# Altium footprint library NDLib.PCBLIB: 499 footprints (part 7 of 32)
Each footprint in its own frame and in the unit in brackets; x right, y up, seen from the top. Pads: shape width x height; smd on the part's side, far side on the other; paste and mask are expansions set on the pad; w line width, h text height; cw(c..) or ccw(c..) is an arc to the next point about the centre after c.
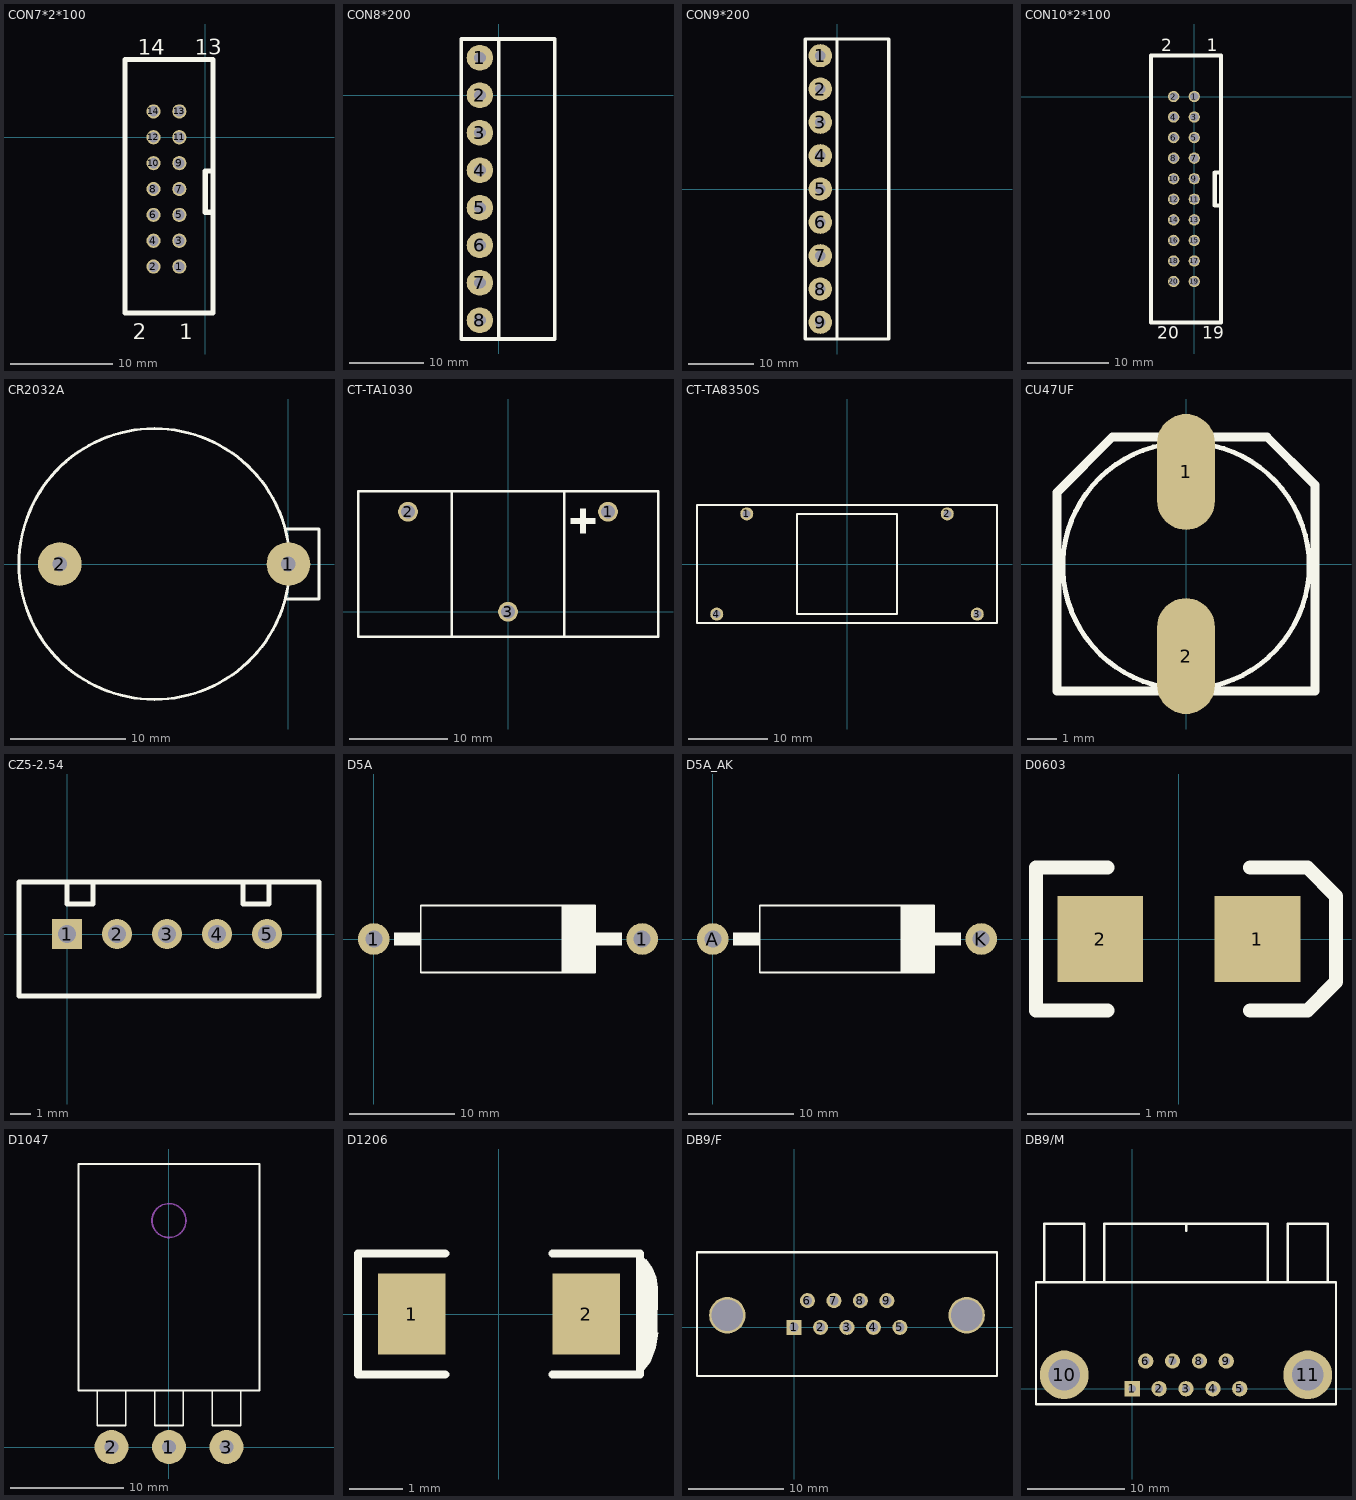
[diagram p6: the footprints below, top view; thin cyan lines are the x and y axes]

## CON7*2*100 [mil]
pads (14):
  round 55 hole 40: 1(-100,-500) 2(-200,-500) 3(-100,-400) 4(-200,-400) 5(-100,-300) 6(-200,-300) 7(-100,-200) 8(-200,-200) 9(-100,-100) 10(-200,-100) 11(-100,0) 12(-200,0) 13(-100,100) 14(-200,100)
TopOverlay:
  lines w19.68: -310,-680 -310,300 30,300 30,-680 -310,-680 ; 0,-290 30,-290 30,-130 0,-130 0,-290
  text "14" at -260,320 h60
  text "1" at -100,-780 h60
  text "2" at -280,-780 h60
  text "13" at -40,320 h60

## CON8*200 [mm]
pads (8):
  oval 3.58x3.5 hole 1.6: 1(-2.54,5.08) 2(-2.54,0) 3(-2.54,-5.08) 4(-2.54,-10.16) 5(-2.54,-15.24) 6(-2.54,-20.32) 7(-2.54,-25.4) 8(-2.54,-30.48)
TopOverlay:
  lines w0.5: -5.08,7.62 0,7.62 ; -5.08,7.62 7.62,7.62 7.62,-33.02 -5.08,-33.02 -5.08,7.62 ; 0,7.62 0,-33.02 0,7.62

## CON9*200 [mm]
pads (9):
  oval 3.58x3.5 hole 1.6: 1(-2.54,20.32) 2(-2.54,15.24) 3(-2.54,10.16) 4(-2.54,5.08) 5(-2.54,0) 6(-2.54,-5.08) 7(-2.54,-10.16) 8(-2.54,-15.24) 9(-2.54,-20.32)
TopOverlay:
  lines w0.5: 0,-22.86 0,22.86 ; -4.826,-22.86 7.874,-22.86 7.874,22.86 -4.826,22.86 -4.826,-22.86

## CON10*2*100 [mil]
pads (20):
  round 55 hole 40: 1(0,0) 2(-100,0) 3(0,-100) 4(-100,-100) 5(0,-200) 6(-100,-200) 7(0,-300) 8(-100,-300) 9(0,-400) 10(-100,-400) 11(0,-500) 12(-100,-500) 13(0,-600) 14(-100,-600) 15(0,-700) 16(-100,-700) 17(0,-800) 18(-100,-800) 19(0,-900) 20(-100,-900)
TopOverlay:
  lines w19.68: -210,-1100 -210,200 130,200 130,-1100 -210,-1100 ; 100,-530 130,-530 130,-370 100,-370 100,-530
  text "2" at -160,220 h60
  text "19" at 40,-1180 h60
  text "20" at -180,-1180 h60
  text "1" at 60,220 h60

## CR2032A [mil]
pads (2):
  round 150 hole 50: 1(0,0) 2(-785,0)
TopOverlay:
  circle w10: c-460,0 r465
  lines w10: -10,-120 105,-120 105,120 -10,120

## CT-TA1030 [mm]
height 39
pads (3):
  round 2 hole 1.397: 1(10.16,10.16) 2(-10.16,10.16) 3(0,0)
TopOverlay:
  region: 7.938,7.938 7.938,10.477 7.302,10.477 7.302,7.938
  rectangle: 6.35,8.89 8.89,9.525
  lines w0.254: -15.24,-2.54 15.24,-2.54 15.24,12.24 -15.24,12.24 -15.24,-2.54 ; -5.715,-2.54 5.715,-2.54 5.715,12.24 -5.715,12.24 -5.715,-2.54

## CT-TA8350S [mil]
height 1535.43
pads (4):
  round 65 hole 40: 1(-500,250) 2(500,250) 3(649.61,-250) 4(-649.61,-250)
TopOverlay:
  lines w10: -748.03,-295.28 -748.03,295.28 748.03,295.28 748.03,-295.28 -748.03,-295.28 ; -250,-250 -250,250 250,250 250,-250 -250,-250

## CU47UF [mm]
height 8
pads (2):
  oval 2x4 smd: 1(0,3.175) 2(0,-3.175)
TopOverlay:
  circle w0.17: c0,-0.063 r4.25
  lines w0.305: -4.445,-4.381 4.445,-4.381 4.445,2.731 2.794,4.382 -2.54,4.382 -4.445,2.477 -4.445,-4.381

## CZ5-2.54 [mm]
height 5.08
pads (5):
  rect 1.5x1.5 hole 0.9: 1(0,0)
  round 1.5 hole 0.9: 2(2.5,0) 3(5,0) 4(7.5,0) 5(10,0)
TopOverlay:
  lines w0.254: 0,2.6 0,1.5 1.3,1.5 1.3,2.6 ; 8.8,2.6 8.8,1.5 10.1,1.5 10.1,2.6 ; -2.4,-3.1 -2.4,2.6 12.6,2.6 12.6,-3.1 -2.4,-3.1
3D body: height 7, standoff -3.4, extent -2.511,-3.388 12.519,2.362

## D5A [mm]
pads (2):
  round 3 hole 1.6: 1(0,0) 1(25.4,0)
TopOverlay:
  rectangle: 17.78,-3.175 20.955,3.175
  rectangle: 1.905,-0.635 4.445,0.635
  region: 23.495,0.635 20.955,0.635 20.955,-0.635 23.495,-0.635
  lines w0.152: 4.445,-3.175 20.955,-3.175 20.955,3.175 4.445,3.175 4.445,-3.175

## D5A_AK [mm]
height 4
pads (2):
  round 3 hole 1.6: A(0,0) K(25.4,0)
TopOverlay:
  rectangle: 17.78,-3.175 20.955,3.175
  rectangle: 1.905,-0.635 4.445,0.635
  region: 23.495,0.635 20.955,0.635 20.955,-0.635 23.495,-0.635
  lines w0.152: 4.445,-3.175 20.955,-3.175 20.955,3.175 4.445,3.175 4.445,-3.175
3D body: height 4.33, standoff 0, extent 7.226,-1.333 15.634,1.334

## D0603 [mil]
pads (2):
  rect 30x30 smd: 1(27.5,0) 2(-27.5,0)
TopOverlay:
  lines w5: -25,-25 -50,-25 -50,25 -25,25 ; 25,-25 45,-25 55,-15 55,15 45,25 25,25

## D1047 [mm]
pads (3):
  round 3 hole 1.2: 1(0,0) 2(-5.08,0) 3(5.08,0)
TopOverlay:
  lines w0.152: -6.35,5 -6.35,1.905 -3.81,1.905 -3.81,5 ; -1.27,5 -1.27,1.905 1.27,1.905 1.27,5 ; 3.81,5 3.81,1.905 6.35,1.905 6.35,5 ; -8,5 8,5 8,25 -8,25 -8,5
Mechanical1:
  circle w0.152: c0,20 r1.5

## D1206 [mil]
pads (2):
  rect 50x60 smd: 1(-65,0) 2(65,0)
TopOverlay:
  region: 105,-45 105.61,-44.93 112.59,-35.82 116.99,-25.21 118.49,-13.83 118.11,-13.83 118.36,19.68 117.35,27.38 114.38,34.54 109.66,40.7 109.48,40.52 105,45
  lines w6: -40,-45 -105,-45 -105,45 -40,45 ; 40,-45 105,-45 105,45 40,45

## DB9/F [mil]
pads (11):
  rect 62x62 hole 38: 1(0.16,-0.12)
  round 62 hole 38: 2(109.16,-0.12) 3(218.16,-0.12) 4(327.16,-0.12) 5(436.16,-0.12) 6(55.16,109.88) 7(164.16,109.88) 8(273.16,109.88) 9(382.16,109.88)
  round 150 hole 130: ""(-274.84,49.88) ""(711.16,49.88)
TopOverlay:
  lines w8: -399.84,-200.12 836.16,-200.12 836.16,309.88
  lines w10: -399.84,-200.12 -399.84,309.88 836.16,309.88
3D body: height 185.53, standoff -565.47, extent -393.49,-202.3 819.51,416.7

## DB9/M [mm]
pads (11):
  rect 1.575x1.575 hole 0.8: 1(0,0)
  round 1.575 hole 0.8: 2(2.76,0) 3(5.52,0) 4(8.28,0) 5(11.04,0) 6(1.38,2.84) 7(4.14,2.84) 8(6.9,2.84) 9(9.66,2.84)
  round 5 hole 3.25: 10(-6.98,1.42) 11(18.02,1.42)
TopOverlay:
  lines w0.254: -9.05,10.92 -9.05,16.92 -4.94,16.92 ; -4.91,10.92 -4.91,16.92 ; -2.85,10.92 -2.85,16.92 13.9,16.92 13.9,10.92 ; 5.525,16.2 5.525,16.9 ; 15.95,10.92 15.95,16.92 20.06,16.92 ; 20.09,10.92 20.09,16.92 ; -9.88,-1.58 20.92,-1.58 20.92,10.92 -9.88,10.92 -9.88,-1.58
3D body: height 12.81, standoff -2.91, extent -9.925,-2.012 20.885,17.063